# Altium schematic symbol library jlcpcb_2025_04_resistors_extended_1210.schlib: 2670 symbols (part 12 of 14)
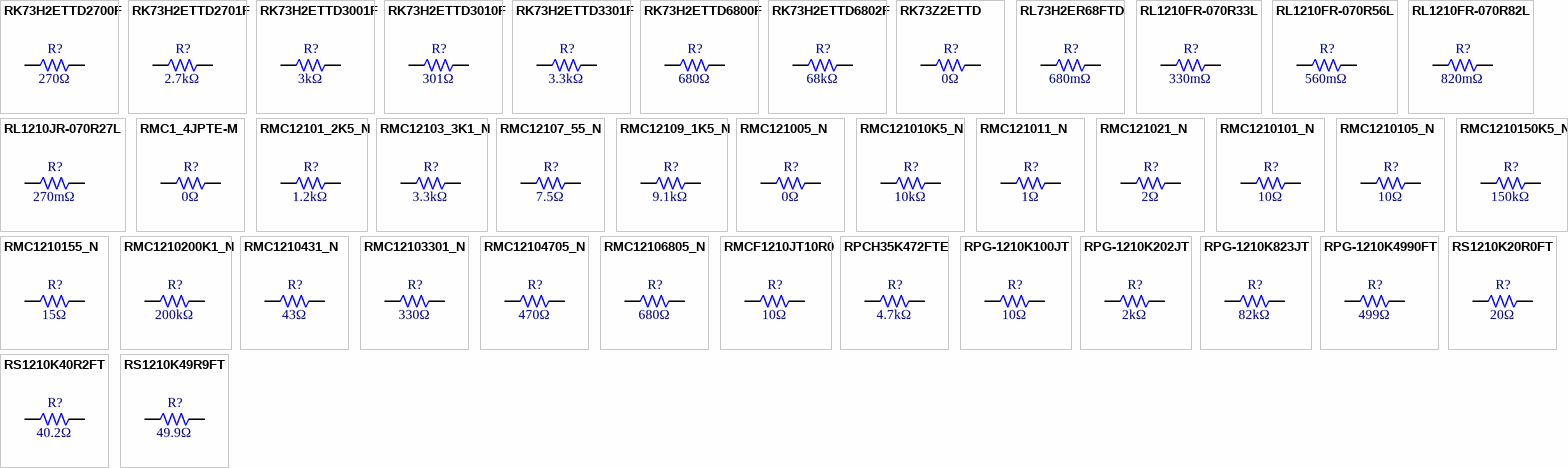
[diagram p77: symbols RK73H2ETTD2700F to RS1210K49R9FT]

## RMC1210105_N
designator R?  Resistance: 10Ω  (hidden comment: *)
Resistor, 10Ω, ±5%, SMD 1210; Manufacturer: Uniroyal; Manufacturer Part Number: RMC1210105%N; Supplier 1: LCSC; Supplier Part Number 1: C269663; JLCPCB Part Number: C269663; Category: Resistors; Package Size: 1210; JLCPCB Basic Part: Yes; Tolerance: ±5%; ComponentLink1Description: Datasheet; ComponentLink1URL: https://wmsc.lcsc.com/wmsc/upload/file/pdf/v2/lcsc/2304140030_TyoHM-RMC1210105-N_C269663.pdf; ComponentLink2Description: JLCPCB Part URL; ComponentLink2URL: https://jlcpcb.com/partdetail/C269663
pins: 1, 2
1 alternate drawing of the same symbol

## RMC1210150K5_N
designator R?  Resistance: 150kΩ  (hidden comment: *)
Resistor, 150kΩ, ±5%, SMD 1210; Manufacturer: Uniroyal; Manufacturer Part Number: RMC1210150K5%N; Supplier 1: LCSC; Supplier Part Number 1: C269664; JLCPCB Part Number: C269664; Category: Resistors; Package Size: 1210; JLCPCB Basic Part: Yes; Tolerance: ±5%; ComponentLink1Description: Datasheet; ComponentLink1URL: https://wmsc.lcsc.com/wmsc/upload/file/pdf/v2/lcsc/2304140030_TyoHM-RMC1210150K5-N_C269664.pdf; ComponentLink2Description: JLCPCB Part URL; ComponentLink2URL: https://jlcpcb.com/partdetail/C269664
pins: 1, 2
1 alternate drawing of the same symbol

## RMC1210155_N
designator R?  Resistance: 15Ω  (hidden comment: *)
Resistor, 15Ω, ±5%, SMD 1210; Manufacturer: Uniroyal; Manufacturer Part Number: RMC1210155%N; Supplier 1: LCSC; Supplier Part Number 1: C269641; JLCPCB Part Number: C269641; Category: Resistors; Package Size: 1210; JLCPCB Basic Part: Yes; Tolerance: ±5%; ComponentLink1Description: Datasheet; ComponentLink1URL: https://wmsc.lcsc.com/wmsc/upload/file/pdf/v2/lcsc/2304140030_TyoHM-RMC1210155-N_C269641.pdf; ComponentLink2Description: JLCPCB Part URL; ComponentLink2URL: https://jlcpcb.com/partdetail/C269641
pins: 1, 2
1 alternate drawing of the same symbol

## RMC1210200K1_N
designator R?  Resistance: 200kΩ  (hidden comment: *)
Resistor, 200kΩ, ±1%, SMD 1210; Manufacturer: Uniroyal; Manufacturer Part Number: RMC1210200K1%N; Supplier 1: LCSC; Supplier Part Number 1: C269665; JLCPCB Part Number: C269665; Category: Resistors; Package Size: 1210; JLCPCB Basic Part: Yes; Tolerance: ±1%; ComponentLink1Description: Datasheet; ComponentLink1URL: https://wmsc.lcsc.com/wmsc/upload/file/pdf/v2/lcsc/2304140030_TyoHM-RMC1210200K1-N_C269665.pdf; ComponentLink2Description: JLCPCB Part URL; ComponentLink2URL: https://jlcpcb.com/partdetail/C269665
pins: 1, 2
1 alternate drawing of the same symbol

## RMC1210431_N
designator R?  Resistance: 43Ω  (hidden comment: *)
Resistor, 43Ω, ±1%, SMD 1210; Manufacturer: Uniroyal; Manufacturer Part Number: RMC1210431%N; Supplier 1: LCSC; Supplier Part Number 1: C269668; JLCPCB Part Number: C269668; Category: Resistors; Package Size: 1210; JLCPCB Basic Part: Yes; Tolerance: ±1%; ComponentLink1Description: Datasheet; ComponentLink1URL: https://wmsc.lcsc.com/wmsc/upload/file/pdf/v2/lcsc/2304140030_TyoHM-RMC1210431-N_C269668.pdf; ComponentLink2Description: JLCPCB Part URL; ComponentLink2URL: https://jlcpcb.com/partdetail/C269668
pins: 1, 2
1 alternate drawing of the same symbol

## RMC12103301_N
designator R?  Resistance: 330Ω  (hidden comment: *)
Resistor, 330Ω, ±1%, SMD 1210; Manufacturer: Uniroyal; Manufacturer Part Number: RMC12103301%N; Supplier 1: LCSC; Supplier Part Number 1: C269638; JLCPCB Part Number: C269638; Category: Resistors; Package Size: 1210; JLCPCB Basic Part: Yes; Tolerance: ±1%; ComponentLink1Description: Datasheet; ComponentLink1URL: https://wmsc.lcsc.com/wmsc/upload/file/pdf/v2/lcsc/2304140030_TyoHM-RMC12103301-N_C269638.pdf; ComponentLink2Description: JLCPCB Part URL; ComponentLink2URL: https://jlcpcb.com/partdetail/C269638
pins: 1, 2
1 alternate drawing of the same symbol

## RMC12104705_N
designator R?  Resistance: 470Ω  (hidden comment: *)
Resistor, 470Ω, ±5%, SMD 1210; Manufacturer: Uniroyal; Manufacturer Part Number: RMC12104705%N; Supplier 1: LCSC; Supplier Part Number 1: C269642; JLCPCB Part Number: C269642; Category: Resistors; Package Size: 1210; JLCPCB Basic Part: Yes; Tolerance: ±5%; ComponentLink1Description: Datasheet; ComponentLink1URL: https://wmsc.lcsc.com/wmsc/upload/file/pdf/v2/lcsc/2304140030_TyoHM-RMC12104705-N_C269642.pdf; ComponentLink2Description: JLCPCB Part URL; ComponentLink2URL: https://jlcpcb.com/partdetail/C269642
pins: 1, 2
1 alternate drawing of the same symbol

## RMC12106805_N
designator R?  Resistance: 680Ω  (hidden comment: *)
Resistor, 680Ω, ±5%, 250mW, SMD 1210; Manufacturer: Uniroyal; Manufacturer Part Number: RMC12106805%N; Supplier 1: LCSC; Supplier Part Number 1: C269643; JLCPCB Part Number: C269643; Power Rating: 250mW; Category: Resistors; Package Size: 1210; JLCPCB Basic Part: Yes; Tolerance: ±5%; ComponentLink1Description: Datasheet; ComponentLink1URL: https://wmsc.lcsc.com/wmsc/upload/file/pdf/v2/lcsc/2304140030_TyoHM-RMC12106805-N_C269643.pdf; ComponentLink2Description: JLCPCB Part URL; ComponentLink2URL: https://jlcpcb.com/partdetail/C269643
pins: 1, 2
1 alternate drawing of the same symbol

## RMCF1210JT10R0
designator R?  Resistance: 10Ω  (hidden comment: *)
Resistor, 10Ω, ±5%, 500mW, 200V, ±200ppm/℃, -55℃~+155℃, SMD 1210; Manufacturer: Uniroyal; Manufacturer Part Number: RMCF1210JT10R0; Supplier 1: LCSC; Supplier Part Number 1: C237736; JLCPCB Part Number: C237736; Power Rating: 500mW; Category: Resistors; Package Size: 1210; JLCPCB Basic Part: Yes; Tolerance: ±5%; Voltage Rating: 200V; Temperature Coefficient: ±200ppm/℃; Temperature Rating: -55℃~+155℃; ComponentLink1Description: Datasheet; ComponentLink1URL: https://wmsc.lcsc.com/wmsc/upload/file/pdf/v2/lcsc/2304140030_SEI-Stackpole-Elec-RMCF1210JT10R0_C237736.pdf; ComponentLink2Description: JLCPCB Part URL; ComponentLink2URL: https://jlcpcb.com/partdetail/C237736
pins: 1, 2
1 alternate drawing of the same symbol

## RPCH35K472FTE
designator R?  Resistance: 4.7kΩ  (hidden comment: *)
Resistor, 4.7kΩ, ±1%, 750mW, ±100ppm/℃, SMD 1210; Manufacturer: Uniroyal; Manufacturer Part Number: RPCH35K472FTE; Supplier 1: LCSC; Supplier Part Number 1: C340545; JLCPCB Part Number: C340545; Power Rating: 750mW; Category: Resistors; Package Size: 1210; JLCPCB Basic Part: Yes; Tolerance: ±1%; Temperature Coefficient: ±100ppm/℃; ComponentLink1Description: Datasheet; ComponentLink1URL: https://wmsc.lcsc.com/wmsc/upload/file/pdf/v2/lcsc/2304140030_KAMAYA-RPCH35K472FTE_C340545.pdf; ComponentLink2Description: JLCPCB Part URL; ComponentLink2URL: https://jlcpcb.com/partdetail/C340545
pins: 1, 2
1 alternate drawing of the same symbol

## RPG-1210K100JT
designator R?  Resistance: 10Ω  (hidden comment: *)
Resistor, 10Ω, ±5%, 500mW, ±100ppm/℃, -55℃~+155℃, SMD 1210; Manufacturer: Uniroyal; Manufacturer Part Number: RPG-1210K100JT; Supplier 1: LCSC; Supplier Part Number 1: C2991631; JLCPCB Part Number: C2991631; Power Rating: 500mW; Category: Resistors; Package Size: 1210; JLCPCB Basic Part: Yes; Tolerance: ±5%; Temperature Coefficient: ±100ppm/℃; Temperature Rating: -55℃~+155℃; ComponentLink1Description: Datasheet; ComponentLink1URL: https://wmsc.lcsc.com/wmsc/upload/file/pdf/v2/lcsc/2204111630_FH--Guangdong-Fenghua-Advanced-Tech-RPG-1210K100JT_C2991631.pdf; ComponentLink2Description: JLCPCB Part URL; ComponentLink2URL: https://jlcpcb.com/partdetail/C2991631
pins: 1, 2
1 alternate drawing of the same symbol

## RPG-1210K202JT
designator R?  Resistance: 2kΩ  (hidden comment: *)
Resistor, 2kΩ, ±5%, 500mW, ±100ppm/℃, -55℃~+155℃, SMD 1210; Manufacturer: Uniroyal; Manufacturer Part Number: RPG-1210K202JT; Supplier 1: LCSC; Supplier Part Number 1: C2961472; JLCPCB Part Number: C2961472; Power Rating: 500mW; Category: Resistors; Package Size: 1210; JLCPCB Basic Part: Yes; Tolerance: ±5%; Temperature Coefficient: ±100ppm/℃; Temperature Rating: -55℃~+155℃; ComponentLink1Description: Datasheet; ComponentLink1URL: https://wmsc.lcsc.com/wmsc/upload/file/pdf/v2/lcsc/2202090930_FH--Guangdong-Fenghua-Advanced-Tech-RPG-1210K202JT_C2961472.pdf; ComponentLink2Description: JLCPCB Part URL; ComponentLink2URL: https://jlcpcb.com/partdetail/C2961472
pins: 1, 2
1 alternate drawing of the same symbol

## RPG-1210K823JT
designator R?  Resistance: 82kΩ  (hidden comment: *)
Resistor, 82kΩ, ±5%, 500mW, ±100ppm/℃, -55℃~+155℃, SMD 1210; Manufacturer: Uniroyal; Manufacturer Part Number: RPG-1210K823JT; Supplier 1: LCSC; Supplier Part Number 1: C2961474; JLCPCB Part Number: C2961474; Power Rating: 500mW; Category: Resistors; Package Size: 1210; JLCPCB Basic Part: Yes; Tolerance: ±5%; Temperature Coefficient: ±100ppm/℃; Temperature Rating: -55℃~+155℃; ComponentLink1Description: Datasheet; ComponentLink1URL: https://wmsc.lcsc.com/wmsc/upload/file/pdf/v2/lcsc/2202090930_FH--Guangdong-Fenghua-Advanced-Tech-RPG-1210K823JT_C2961474.pdf; ComponentLink2Description: JLCPCB Part URL; ComponentLink2URL: https://jlcpcb.com/partdetail/C2961474
pins: 1, 2
1 alternate drawing of the same symbol

## RPG-1210K4990FT
designator R?  Resistance: 499Ω  (hidden comment: *)
Resistor, 499Ω, ±1%, 500mW, 200V, ±100ppm/℃, -55℃~+155℃, SMD 1210; Manufacturer: Uniroyal; Manufacturer Part Number: RPG-1210K4990FT; Supplier 1: LCSC; Supplier Part Number 1: C341631; JLCPCB Part Number: C341631; Power Rating: 500mW; Category: Resistors; Package Size: 1210; JLCPCB Basic Part: Yes; Tolerance: ±1%; Voltage Rating: 200V; Temperature Coefficient: ±100ppm/℃; Temperature Rating: -55℃~+155℃; ComponentLink1Description: Datasheet; ComponentLink1URL: https://wmsc.lcsc.com/wmsc/upload/file/pdf/v2/lcsc/2304140030_FH--Guangdong-Fenghua-Advanced-Tech-RPG-1210K4990FT_C341631.pdf; ComponentLink2Description: JLCPCB Part URL; ComponentLink2URL: https://jlcpcb.com/partdetail/C341631
pins: 1, 2
1 alternate drawing of the same symbol

## RS1210K20R0FT
designator R?  Resistance: 20Ω  (hidden comment: *)
Resistor, 20Ω, ±1%, 333.333mW, ±100ppm/℃, SMD 1210; Manufacturer: Uniroyal; Manufacturer Part Number: RS1210K20R0FT; Supplier 1: LCSC; Supplier Part Number 1: C1322500; JLCPCB Part Number: C1322500; Power Rating: 333.333mW; Category: Resistors; Package Size: 1210; JLCPCB Basic Part: Yes; Tolerance: ±1%; Temperature Coefficient: ±100ppm/℃; ComponentLink1Description: Datasheet; ComponentLink1URL: https://wmsc.lcsc.com/wmsc/upload/file/pdf/v2/lcsc/2304140030_FH--Guangdong-Fenghua-Advanced-Tech-RS1210K20R0FT_C1322500.pdf; ComponentLink2Description: JLCPCB Part URL; ComponentLink2URL: https://jlcpcb.com/partdetail/C1322500
pins: 1, 2
1 alternate drawing of the same symbol

## RS1210K40R2FT
designator R?  Resistance: 40.2Ω  (hidden comment: *)
Resistor, 40.2Ω, ±1%, 333.333mW, ±100ppm/℃, SMD 1210; Manufacturer: Uniroyal; Manufacturer Part Number: RS1210K40R2FT; Supplier 1: LCSC; Supplier Part Number 1: C1322515; JLCPCB Part Number: C1322515; Power Rating: 333.333mW; Category: Resistors; Package Size: 1210; JLCPCB Basic Part: Yes; Tolerance: ±1%; Temperature Coefficient: ±100ppm/℃; ComponentLink1Description: Datasheet; ComponentLink1URL: https://wmsc.lcsc.com/wmsc/upload/file/pdf/v2/lcsc/2304140030_FH--Guangdong-Fenghua-Advanced-Tech-RS1210K40R2FT_C1322515.pdf; ComponentLink2Description: JLCPCB Part URL; ComponentLink2URL: https://jlcpcb.com/partdetail/C1322515
pins: 1, 2
1 alternate drawing of the same symbol

## RS1210K49R9FT
designator R?  Resistance: 49.9Ω  (hidden comment: *)
Resistor, 49.9Ω, ±1%, 333.333mW, ±100ppm/℃, SMD 1210; Manufacturer: Uniroyal; Manufacturer Part Number: RS1210K49R9FT; Supplier 1: LCSC; Supplier Part Number 1: C1322519; JLCPCB Part Number: C1322519; Power Rating: 333.333mW; Category: Resistors; Package Size: 1210; JLCPCB Basic Part: Yes; Tolerance: ±1%; Temperature Coefficient: ±100ppm/℃; ComponentLink1Description: Datasheet; ComponentLink1URL: https://wmsc.lcsc.com/wmsc/upload/file/pdf/v2/lcsc/2304140030_FH--Guangdong-Fenghua-Advanced-Tech-RS1210K49R9FT_C1322519.pdf; ComponentLink2Description: JLCPCB Part URL; ComponentLink2URL: https://jlcpcb.com/partdetail/C1322519
pins: 1, 2
1 alternate drawing of the same symbol

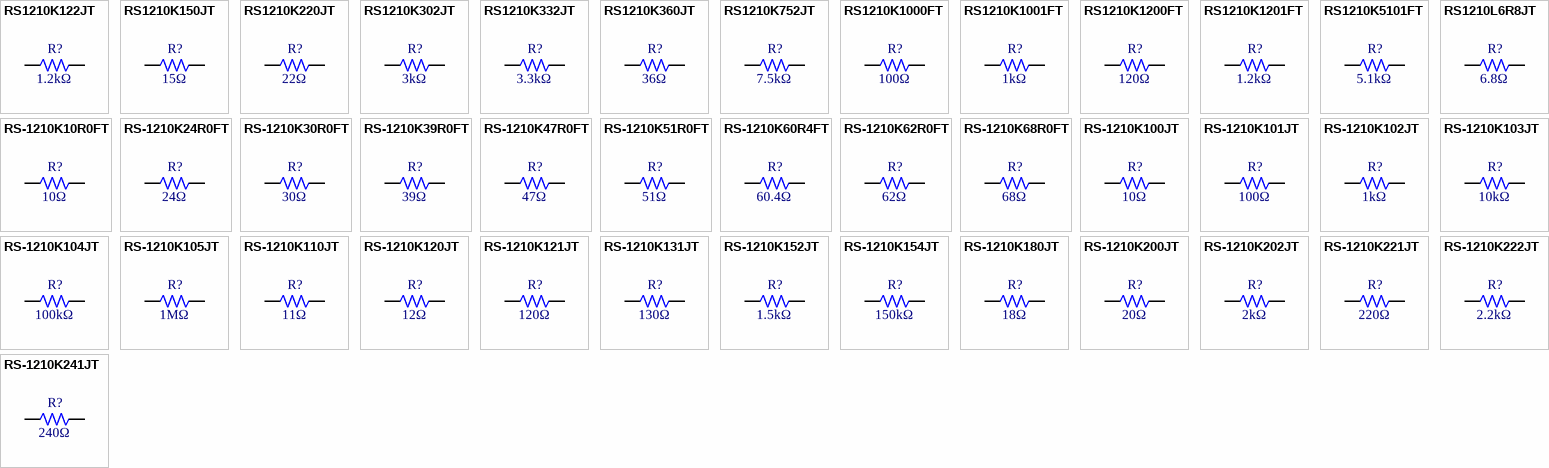
[diagram p54: symbols RS1210K122JT to RS-1210K241JT]

## RS1210K122JT
designator R?  Resistance: 1.2kΩ  (hidden comment: *)
Resistor, 1.2kΩ, ±5%, 333.333mW, ±100ppm/℃, SMD 1210; Manufacturer: Uniroyal; Manufacturer Part Number: RS1210K122JT; Supplier 1: LCSC; Supplier Part Number 1: C1322491; JLCPCB Part Number: C1322491; Power Rating: 333.333mW; Category: Resistors; Package Size: 1210; JLCPCB Basic Part: Yes; Tolerance: ±5%; Temperature Coefficient: ±100ppm/℃; ComponentLink1Description: Datasheet; ComponentLink1URL: https://wmsc.lcsc.com/wmsc/upload/file/pdf/v2/lcsc/2304140030_FH--Guangdong-Fenghua-Advanced-Tech-RS1210K122JT_C1322491.pdf; ComponentLink2Description: JLCPCB Part URL; ComponentLink2URL: https://jlcpcb.com/partdetail/C1322491
pins: 1, 2
1 alternate drawing of the same symbol

## RS1210K150JT
designator R?  Resistance: 15Ω  (hidden comment: *)
Resistor, 15Ω, ±5%, 333.333mW, ±100ppm/℃, SMD 1210; Manufacturer: Uniroyal; Manufacturer Part Number: RS1210K150JT; Supplier 1: LCSC; Supplier Part Number 1: C1322495; JLCPCB Part Number: C1322495; Power Rating: 333.333mW; Category: Resistors; Package Size: 1210; JLCPCB Basic Part: Yes; Tolerance: ±5%; Temperature Coefficient: ±100ppm/℃; ComponentLink1Description: Datasheet; ComponentLink1URL: https://wmsc.lcsc.com/wmsc/upload/file/pdf/v2/lcsc/2304140030_FH--Guangdong-Fenghua-Advanced-Tech-RS1210K150JT_C1322495.pdf; ComponentLink2Description: JLCPCB Part URL; ComponentLink2URL: https://jlcpcb.com/partdetail/C1322495
pins: 1, 2
1 alternate drawing of the same symbol

## RS1210K220JT
designator R?  Resistance: 22Ω  (hidden comment: *)
Resistor, 22Ω, ±5%, 333.333mW, ±100ppm/℃, SMD 1210; Manufacturer: Uniroyal; Manufacturer Part Number: RS1210K220JT; Supplier 1: LCSC; Supplier Part Number 1: C1322503; JLCPCB Part Number: C1322503; Power Rating: 333.333mW; Category: Resistors; Package Size: 1210; JLCPCB Basic Part: Yes; Tolerance: ±5%; Temperature Coefficient: ±100ppm/℃; ComponentLink1Description: Datasheet; ComponentLink1URL: https://wmsc.lcsc.com/wmsc/upload/file/pdf/v2/lcsc/2304140030_FH--Guangdong-Fenghua-Advanced-Tech-RS1210K220JT_C1322503.pdf; ComponentLink2Description: JLCPCB Part URL; ComponentLink2URL: https://jlcpcb.com/partdetail/C1322503
pins: 1, 2
1 alternate drawing of the same symbol

## RS1210K302JT
designator R?  Resistance: 3kΩ  (hidden comment: *)
Resistor, 3kΩ, ±5%, 333.333mW, ±100ppm/℃, SMD 1210; Manufacturer: Uniroyal; Manufacturer Part Number: RS1210K302JT; Supplier 1: LCSC; Supplier Part Number 1: C1322510; JLCPCB Part Number: C1322510; Power Rating: 333.333mW; Category: Resistors; Package Size: 1210; JLCPCB Basic Part: Yes; Tolerance: ±5%; Temperature Coefficient: ±100ppm/℃; ComponentLink1Description: Datasheet; ComponentLink1URL: https://wmsc.lcsc.com/wmsc/upload/file/pdf/v2/lcsc/2304140030_FH--Guangdong-Fenghua-Advanced-Tech-RS1210K302JT_C1322510.pdf; ComponentLink2Description: JLCPCB Part URL; ComponentLink2URL: https://jlcpcb.com/partdetail/C1322510
pins: 1, 2
1 alternate drawing of the same symbol

## RS1210K332JT
designator R?  Resistance: 3.3kΩ  (hidden comment: *)
Resistor, 3.3kΩ, ±5%, 333.333mW, ±100ppm/℃, SMD 1210; Manufacturer: Uniroyal; Manufacturer Part Number: RS1210K332JT; Supplier 1: LCSC; Supplier Part Number 1: C1322512; JLCPCB Part Number: C1322512; Power Rating: 333.333mW; Category: Resistors; Package Size: 1210; JLCPCB Basic Part: Yes; Tolerance: ±5%; Temperature Coefficient: ±100ppm/℃; ComponentLink1Description: Datasheet; ComponentLink1URL: https://wmsc.lcsc.com/wmsc/upload/file/pdf/v2/lcsc/2304140030_FH--Guangdong-Fenghua-Advanced-Tech-RS1210K332JT_C1322512.pdf; ComponentLink2Description: JLCPCB Part URL; ComponentLink2URL: https://jlcpcb.com/partdetail/C1322512
pins: 1, 2
1 alternate drawing of the same symbol

## RS1210K360JT
designator R?  Resistance: 36Ω  (hidden comment: *)
Resistor, 36Ω, ±5%, 333.333mW, ±100ppm/℃, SMD 1210; Manufacturer: Uniroyal; Manufacturer Part Number: RS1210K360JT; Supplier 1: LCSC; Supplier Part Number 1: C1322514; JLCPCB Part Number: C1322514; Power Rating: 333.333mW; Category: Resistors; Package Size: 1210; JLCPCB Basic Part: Yes; Tolerance: ±5%; Temperature Coefficient: ±100ppm/℃; ComponentLink1Description: Datasheet; ComponentLink1URL: https://wmsc.lcsc.com/wmsc/upload/file/pdf/v2/lcsc/2304140030_FH--Guangdong-Fenghua-Advanced-Tech-RS1210K360JT_C1322514.pdf; ComponentLink2Description: JLCPCB Part URL; ComponentLink2URL: https://jlcpcb.com/partdetail/C1322514
pins: 1, 2
1 alternate drawing of the same symbol

## RS1210K752JT
designator R?  Resistance: 7.5kΩ  (hidden comment: *)
Resistor, 7.5kΩ, ±5%, 333.333mW, ±100ppm/℃, SMD 1210; Manufacturer: Uniroyal; Manufacturer Part Number: RS1210K752JT; Supplier 1: LCSC; Supplier Part Number 1: C1322528; JLCPCB Part Number: C1322528; Power Rating: 333.333mW; Category: Resistors; Package Size: 1210; JLCPCB Basic Part: Yes; Tolerance: ±5%; Temperature Coefficient: ±100ppm/℃; ComponentLink1Description: Datasheet; ComponentLink1URL: https://wmsc.lcsc.com/wmsc/upload/file/pdf/v2/lcsc/2304140030_FH--Guangdong-Fenghua-Advanced-Tech-RS1210K752JT_C1322528.pdf; ComponentLink2Description: JLCPCB Part URL; ComponentLink2URL: https://jlcpcb.com/partdetail/C1322528
pins: 1, 2
1 alternate drawing of the same symbol

## RS1210K1000FT
designator R?  Resistance: 100Ω  (hidden comment: *)
Resistor, 100Ω, ±1%, 333.333mW, ±100ppm/℃, SMD 1210; Manufacturer: Uniroyal; Manufacturer Part Number: RS1210K1000FT; Supplier 1: LCSC; Supplier Part Number 1: C1322487; JLCPCB Part Number: C1322487; Power Rating: 333.333mW; Category: Resistors; Package Size: 1210; JLCPCB Basic Part: Yes; Tolerance: ±1%; Temperature Coefficient: ±100ppm/℃; ComponentLink1Description: Datasheet; ComponentLink1URL: https://wmsc.lcsc.com/wmsc/upload/file/pdf/v2/lcsc/2304140030_FH--Guangdong-Fenghua-Advanced-Tech-RS1210K1000FT_C1322487.pdf; ComponentLink2Description: JLCPCB Part URL; ComponentLink2URL: https://jlcpcb.com/partdetail/C1322487
pins: 1, 2
1 alternate drawing of the same symbol

## RS1210K1001FT
designator R?  Resistance: 1kΩ  (hidden comment: *)
Resistor, 1kΩ, ±1%, 333.333mW, ±100ppm/℃, SMD 1210; Manufacturer: Uniroyal; Manufacturer Part Number: RS1210K1001FT; Supplier 1: LCSC; Supplier Part Number 1: C1322488; JLCPCB Part Number: C1322488; Power Rating: 333.333mW; Category: Resistors; Package Size: 1210; JLCPCB Basic Part: Yes; Tolerance: ±1%; Temperature Coefficient: ±100ppm/℃; ComponentLink1Description: Datasheet; ComponentLink1URL: https://wmsc.lcsc.com/wmsc/upload/file/pdf/v2/lcsc/2304140030_FH--Guangdong-Fenghua-Advanced-Tech-RS1210K1001FT_C1322488.pdf; ComponentLink2Description: JLCPCB Part URL; ComponentLink2URL: https://jlcpcb.com/partdetail/C1322488
pins: 1, 2
1 alternate drawing of the same symbol

## RS1210K1200FT
designator R?  Resistance: 120Ω  (hidden comment: *)
Resistor, 120Ω, ±1%, 333.333mW, ±100ppm/℃, SMD 1210; Manufacturer: Uniroyal; Manufacturer Part Number: RS1210K1200FT; Supplier 1: LCSC; Supplier Part Number 1: C1322489; JLCPCB Part Number: C1322489; Power Rating: 333.333mW; Category: Resistors; Package Size: 1210; JLCPCB Basic Part: Yes; Tolerance: ±1%; Temperature Coefficient: ±100ppm/℃; ComponentLink1Description: Datasheet; ComponentLink1URL: https://wmsc.lcsc.com/wmsc/upload/file/pdf/v2/lcsc/2304140030_FH--Guangdong-Fenghua-Advanced-Tech-RS1210K1200FT_C1322489.pdf; ComponentLink2Description: JLCPCB Part URL; ComponentLink2URL: https://jlcpcb.com/partdetail/C1322489
pins: 1, 2
1 alternate drawing of the same symbol

## RS1210K1201FT
designator R?  Resistance: 1.2kΩ  (hidden comment: *)
Resistor, 1.2kΩ, ±1%, 333.333mW, ±100ppm/℃, SMD 1210; Manufacturer: Uniroyal; Manufacturer Part Number: RS1210K1201FT; Supplier 1: LCSC; Supplier Part Number 1: C1322490; JLCPCB Part Number: C1322490; Power Rating: 333.333mW; Category: Resistors; Package Size: 1210; JLCPCB Basic Part: Yes; Tolerance: ±1%; Temperature Coefficient: ±100ppm/℃; ComponentLink1Description: Datasheet; ComponentLink1URL: https://wmsc.lcsc.com/wmsc/upload/file/pdf/v2/lcsc/2304140030_FH--Guangdong-Fenghua-Advanced-Tech-RS1210K1201FT_C1322490.pdf; ComponentLink2Description: JLCPCB Part URL; ComponentLink2URL: https://jlcpcb.com/partdetail/C1322490
pins: 1, 2
1 alternate drawing of the same symbol

## RS1210K5101FT
designator R?  Resistance: 5.1kΩ  (hidden comment: *)
Resistor, 5.1kΩ, ±1%, 333.333mW, ±100ppm/℃, SMD 1210; Manufacturer: Uniroyal; Manufacturer Part Number: RS1210K5101FT; Supplier 1: LCSC; Supplier Part Number 1: C1322520; JLCPCB Part Number: C1322520; Power Rating: 333.333mW; Category: Resistors; Package Size: 1210; JLCPCB Basic Part: Yes; Tolerance: ±1%; Temperature Coefficient: ±100ppm/℃; ComponentLink1Description: Datasheet; ComponentLink1URL: https://wmsc.lcsc.com/wmsc/upload/file/pdf/v2/lcsc/2304140030_FH--Guangdong-Fenghua-Advanced-Tech-RS1210K5101FT_C1322520.pdf; ComponentLink2Description: JLCPCB Part URL; ComponentLink2URL: https://jlcpcb.com/partdetail/C1322520
pins: 1, 2
1 alternate drawing of the same symbol

## RS1210L6R8JT
designator R?  Resistance: 6.8Ω  (hidden comment: *)
Resistor, 6.8Ω, ±5%, 333.333mW, ±250ppm/℃, SMD 1210; Manufacturer: Uniroyal; Manufacturer Part Number: RS1210L6R8JT; Supplier 1: LCSC; Supplier Part Number 1: C1322534; JLCPCB Part Number: C1322534; Power Rating: 333.333mW; Category: Resistors; Package Size: 1210; JLCPCB Basic Part: Yes; Tolerance: ±5%; Temperature Coefficient: ±250ppm/℃; ComponentLink1Description: Datasheet; ComponentLink1URL: https://wmsc.lcsc.com/wmsc/upload/file/pdf/v2/lcsc/2304140030_FH--Guangdong-Fenghua-Advanced-Tech-RS1210L6R8JT_C1322534.pdf; ComponentLink2Description: JLCPCB Part URL; ComponentLink2URL: https://jlcpcb.com/partdetail/C1322534
pins: 1, 2
1 alternate drawing of the same symbol

## RS-1210K10R0FT
designator R?  Resistance: 10Ω  (hidden comment: *)
Resistor, 10Ω, ±1%, 333.333mW, 200V, ±100ppm/℃, -55℃~+155℃, SMD 1210; Manufacturer: Uniroyal; Manufacturer Part Number: RS-1210K10R0FT; Supplier 1: LCSC; Supplier Part Number 1: C327447; JLCPCB Part Number: C327447; Power Rating: 333.333mW; Category: Resistors; Package Size: 1210; JLCPCB Basic Part: Yes; Tolerance: ±1%; Voltage Rating: 200V; Temperature Coefficient: ±100ppm/℃; Temperature Rating: -55℃~+155℃; ComponentLink1Description: Datasheet; ComponentLink1URL: https://wmsc.lcsc.com/wmsc/upload/file/pdf/v2/lcsc/2304140030_FH--Guangdong-Fenghua-Advanced-Tech-RS-1210K10R0FT_C327447.pdf; ComponentLink2Description: JLCPCB Part URL; ComponentLink2URL: https://jlcpcb.com/partdetail/C327447
pins: 1, 2
1 alternate drawing of the same symbol

## RS-1210K24R0FT
designator R?  Resistance: 24Ω  (hidden comment: *)
Resistor, 24Ω, ±1%, 333.333mW, 200V, ±100ppm/℃, -55℃~+155℃, SMD 1210; Manufacturer: Uniroyal; Manufacturer Part Number: RS-1210K24R0FT; Supplier 1: LCSC; Supplier Part Number 1: C341618; JLCPCB Part Number: C341618; Power Rating: 333.333mW; Category: Resistors; Package Size: 1210; JLCPCB Basic Part: Yes; Tolerance: ±1%; Voltage Rating: 200V; Temperature Coefficient: ±100ppm/℃; Temperature Rating: -55℃~+155℃; ComponentLink1Description: Datasheet; ComponentLink1URL: https://wmsc.lcsc.com/wmsc/upload/file/pdf/v2/lcsc/2304140030_FH--Guangdong-Fenghua-Advanced-Tech-RS-1210K24R0FT_C341618.pdf; ComponentLink2Description: JLCPCB Part URL; ComponentLink2URL: https://jlcpcb.com/partdetail/C341618
pins: 1, 2
1 alternate drawing of the same symbol

## RS-1210K30R0FT
designator R?  Resistance: 30Ω  (hidden comment: *)
Resistor, 30Ω, ±1%, 333.333mW, ±100ppm/℃, -55℃~+155℃, SMD 1210; Manufacturer: Uniroyal; Manufacturer Part Number: RS-1210K30R0FT; Supplier 1: LCSC; Supplier Part Number 1: C2961541; JLCPCB Part Number: C2961541; Power Rating: 333.333mW; Category: Resistors; Package Size: 1210; JLCPCB Basic Part: Yes; Tolerance: ±1%; Temperature Coefficient: ±100ppm/℃; Temperature Rating: -55℃~+155℃; ComponentLink1Description: Datasheet; ComponentLink1URL: https://wmsc.lcsc.com/wmsc/upload/file/pdf/v2/lcsc/2202211530_FH--Guangdong-Fenghua-Advanced-Tech-RS-1210K30R0FT_C2961541.pdf; ComponentLink2Description: JLCPCB Part URL; ComponentLink2URL: https://jlcpcb.com/partdetail/C2961541
pins: 1, 2
1 alternate drawing of the same symbol

## RS-1210K39R0FT
designator R?  Resistance: 39Ω  (hidden comment: *)
Resistor, 39Ω, ±1%, 333.333mW, ±100ppm/℃, -55℃~+155℃, SMD 1210; Manufacturer: Uniroyal; Manufacturer Part Number: RS-1210K39R0FT; Supplier 1: LCSC; Supplier Part Number 1: C2939822; JLCPCB Part Number: C2939822; Power Rating: 333.333mW; Category: Resistors; Package Size: 1210; JLCPCB Basic Part: Yes; Tolerance: ±1%; Temperature Coefficient: ±100ppm/℃; Temperature Rating: -55℃~+155℃; ComponentLink1Description: Datasheet; ComponentLink1URL: https://wmsc.lcsc.com/wmsc/upload/file/pdf/v2/lcsc/2201121830_FH--Guangdong-Fenghua-Advanced-Tech-RS-1210K39R0FT_C2939822.pdf; ComponentLink2Description: JLCPCB Part URL; ComponentLink2URL: https://jlcpcb.com/partdetail/C2939822
pins: 1, 2
1 alternate drawing of the same symbol

## RS-1210K47R0FT
designator R?  Resistance: 47Ω  (hidden comment: *)
Resistor, 47Ω, ±1%, 250mW, 200V, ±200ppm/℃, SMD 1210; Manufacturer: Uniroyal; Manufacturer Part Number: RS-1210K47R0FT; Supplier 1: LCSC; Supplier Part Number 1: C2936641; JLCPCB Part Number: C2936641; Power Rating: 250mW; Category: Resistors; Package Size: 1210; JLCPCB Basic Part: Yes; Tolerance: ±1%; Voltage Rating: 200V; Temperature Coefficient: ±200ppm/℃; ComponentLink1Description: Datasheet; ComponentLink1URL: https://wmsc.lcsc.com/wmsc/upload/file/pdf/v2/lcsc/2201121730_FH--Guangdong-Fenghua-Advanced-Tech-RS-1210K47R0FT_C2936641.pdf; ComponentLink2Description: JLCPCB Part URL; ComponentLink2URL: https://jlcpcb.com/partdetail/C2936641
pins: 1, 2
1 alternate drawing of the same symbol

## RS-1210K51R0FT
designator R?  Resistance: 51Ω  (hidden comment: *)
Resistor, 51Ω, ±1%, 333.333mW, 200V, ±100ppm/℃, -55℃~+155℃, SMD 1210; Manufacturer: Uniroyal; Manufacturer Part Number: RS-1210K51R0FT; Supplier 1: LCSC; Supplier Part Number 1: C341625; JLCPCB Part Number: C341625; Power Rating: 333.333mW; Category: Resistors; Package Size: 1210; JLCPCB Basic Part: Yes; Tolerance: ±1%; Voltage Rating: 200V; Temperature Coefficient: ±100ppm/℃; Temperature Rating: -55℃~+155℃; ComponentLink1Description: Datasheet; ComponentLink1URL: https://wmsc.lcsc.com/wmsc/upload/file/pdf/v2/lcsc/2304140030_FH--Guangdong-Fenghua-Advanced-Tech-RS-1210K51R0FT_C341625.pdf; ComponentLink2Description: JLCPCB Part URL; ComponentLink2URL: https://jlcpcb.com/partdetail/C341625
pins: 1, 2
1 alternate drawing of the same symbol

## RS-1210K60R4FT
designator R?  Resistance: 60.4Ω  (hidden comment: *)
Resistor, 60.4Ω, ±1%, 250mW, 200V, ±200ppm/℃, SMD 1210; Manufacturer: Uniroyal; Manufacturer Part Number: RS-1210K60R4FT; Supplier 1: LCSC; Supplier Part Number 1: C2936664; JLCPCB Part Number: C2936664; Power Rating: 250mW; Category: Resistors; Package Size: 1210; JLCPCB Basic Part: Yes; Tolerance: ±1%; Voltage Rating: 200V; Temperature Coefficient: ±200ppm/℃; ComponentLink1Description: Datasheet; ComponentLink1URL: https://wmsc.lcsc.com/wmsc/upload/file/pdf/v2/lcsc/2201121730_FH--Guangdong-Fenghua-Advanced-Tech-RS-1210K60R4FT_C2936664.pdf; ComponentLink2Description: JLCPCB Part URL; ComponentLink2URL: https://jlcpcb.com/partdetail/C2936664
pins: 1, 2
1 alternate drawing of the same symbol

## RS-1210K62R0FT
designator R?  Resistance: 62Ω  (hidden comment: *)
Resistor, 62Ω, ±1%, 333.333mW, ±100ppm/℃, -55℃~+155℃, SMD 1210; Manufacturer: Uniroyal; Manufacturer Part Number: RS-1210K62R0FT; Supplier 1: LCSC; Supplier Part Number 1: C2961546; JLCPCB Part Number: C2961546; Power Rating: 333.333mW; Category: Resistors; Package Size: 1210; JLCPCB Basic Part: Yes; Tolerance: ±1%; Temperature Coefficient: ±100ppm/℃; Temperature Rating: -55℃~+155℃; ComponentLink1Description: Datasheet; ComponentLink1URL: https://wmsc.lcsc.com/wmsc/upload/file/pdf/v2/lcsc/2202211530_FH--Guangdong-Fenghua-Advanced-Tech-RS-1210K62R0FT_C2961546.pdf; ComponentLink2Description: JLCPCB Part URL; ComponentLink2URL: https://jlcpcb.com/partdetail/C2961546
pins: 1, 2
1 alternate drawing of the same symbol

## RS-1210K68R0FT
designator R?  Resistance: 68Ω  (hidden comment: *)
Resistor, 68Ω, ±1%, 333.333mW, ±100ppm/℃, SMD 1210; Manufacturer: Uniroyal; Manufacturer Part Number: RS-1210K68R0FT; Supplier 1: LCSC; Supplier Part Number 1: C880430; JLCPCB Part Number: C880430; Power Rating: 333.333mW; Category: Resistors; Package Size: 1210; JLCPCB Basic Part: Yes; Tolerance: ±1%; Temperature Coefficient: ±100ppm/℃; ComponentLink1Description: Datasheet; ComponentLink1URL: https://wmsc.lcsc.com/wmsc/upload/file/pdf/v2/lcsc/2304140030_FH--Guangdong-Fenghua-Advanced-Tech-RS-1210K68R0FT_C880430.pdf; ComponentLink2Description: JLCPCB Part URL; ComponentLink2URL: https://jlcpcb.com/partdetail/C880430
pins: 1, 2
1 alternate drawing of the same symbol

## RS-1210K100JT
designator R?  Resistance: 10Ω  (hidden comment: *)
Resistor, 10Ω, ±5%, 333.333mW, ±100ppm/℃, -55℃~+155℃, SMD 1210; Manufacturer: Uniroyal; Manufacturer Part Number: RS-1210K100JT; Supplier 1: LCSC; Supplier Part Number 1: C139998; JLCPCB Part Number: C139998; Power Rating: 333.333mW; Category: Resistors; Package Size: 1210; JLCPCB Basic Part: Yes; Tolerance: ±5%; Temperature Coefficient: ±100ppm/℃; Temperature Rating: -55℃~+155℃; ComponentLink1Description: Datasheet; ComponentLink1URL: https://wmsc.lcsc.com/wmsc/upload/file/pdf/v2/lcsc/2304140030_FH--Guangdong-Fenghua-Advanced-Tech-RS-1210K100JT_C139998.pdf; ComponentLink2Description: JLCPCB Part URL; ComponentLink2URL: https://jlcpcb.com/partdetail/C139998
pins: 1, 2
1 alternate drawing of the same symbol

## RS-1210K101JT
designator R?  Resistance: 100Ω  (hidden comment: *)
Resistor, 100Ω, ±5%, 333.333mW, 200V, ±100ppm/℃, -55℃~+155℃, SMD 1210; Manufacturer: Uniroyal; Manufacturer Part Number: RS-1210K101JT; Supplier 1: LCSC; Supplier Part Number 1: C139999; JLCPCB Part Number: C139999; Power Rating: 333.333mW; Category: Resistors; Package Size: 1210; JLCPCB Basic Part: Yes; Tolerance: ±5%; Voltage Rating: 200V; Temperature Coefficient: ±100ppm/℃; Temperature Rating: -55℃~+155℃; ComponentLink1Description: Datasheet; ComponentLink1URL: https://wmsc.lcsc.com/wmsc/upload/file/pdf/v2/lcsc/2304140030_FH--Guangdong-Fenghua-Advanced-Tech-RS-1210K101JT_C139999.pdf; ComponentLink2Description: JLCPCB Part URL; ComponentLink2URL: https://jlcpcb.com/partdetail/C139999
pins: 1, 2
1 alternate drawing of the same symbol

## RS-1210K102JT
designator R?  Resistance: 1kΩ  (hidden comment: *)
Resistor, 1kΩ, ±5%, 333.333mW, 200V, ±100ppm/℃, -55℃~+155℃, SMD 1210; Manufacturer: Uniroyal; Manufacturer Part Number: RS-1210K102JT; Supplier 1: LCSC; Supplier Part Number 1: C139997; JLCPCB Part Number: C139997; Power Rating: 333.333mW; Category: Resistors; Package Size: 1210; JLCPCB Basic Part: Yes; Tolerance: ±5%; Voltage Rating: 200V; Temperature Coefficient: ±100ppm/℃; Temperature Rating: -55℃~+155℃; ComponentLink1Description: Datasheet; ComponentLink1URL: https://wmsc.lcsc.com/wmsc/upload/file/pdf/v2/lcsc/2304140030_FH--Guangdong-Fenghua-Advanced-Tech-RS-1210K102JT_C139997.pdf; ComponentLink2Description: JLCPCB Part URL; ComponentLink2URL: https://jlcpcb.com/partdetail/C139997
pins: 1, 2
1 alternate drawing of the same symbol

## RS-1210K103JT
designator R?  Resistance: 10kΩ  (hidden comment: *)
Resistor, 10kΩ, ±5%, 333.333mW, 200V, ±100ppm/℃, -55℃~+155℃, SMD 1210; Manufacturer: Uniroyal; Manufacturer Part Number: RS-1210K103JT; Supplier 1: LCSC; Supplier Part Number 1: C286689; JLCPCB Part Number: C286689; Power Rating: 333.333mW; Category: Resistors; Package Size: 1210; JLCPCB Basic Part: Yes; Tolerance: ±5%; Voltage Rating: 200V; Temperature Coefficient: ±100ppm/℃; Temperature Rating: -55℃~+155℃; ComponentLink1Description: Datasheet; ComponentLink1URL: https://wmsc.lcsc.com/wmsc/upload/file/pdf/v2/lcsc/2304140030_FH--Guangdong-Fenghua-Advanced-Tech-RS-1210K103JT_C286689.pdf; ComponentLink2Description: JLCPCB Part URL; ComponentLink2URL: https://jlcpcb.com/partdetail/C286689
pins: 1, 2
1 alternate drawing of the same symbol

## RS-1210K104JT
designator R?  Resistance: 100kΩ  (hidden comment: *)
Resistor, 100kΩ, ±5%, 333.333mW, 200V, ±100ppm/℃, -55℃~+155℃, SMD 1210; Manufacturer: Uniroyal; Manufacturer Part Number: RS-1210K104JT; Supplier 1: LCSC; Supplier Part Number 1: C304940; JLCPCB Part Number: C304940; Power Rating: 333.333mW; Category: Resistors; Package Size: 1210; JLCPCB Basic Part: Yes; Tolerance: ±5%; Voltage Rating: 200V; Temperature Coefficient: ±100ppm/℃; Temperature Rating: -55℃~+155℃; ComponentLink1Description: Datasheet; ComponentLink1URL: https://wmsc.lcsc.com/wmsc/upload/file/pdf/v2/lcsc/2304140030_FH--Guangdong-Fenghua-Advanced-Tech-RS-1210K104JT_C304940.pdf; ComponentLink2Description: JLCPCB Part URL; ComponentLink2URL: https://jlcpcb.com/partdetail/C304940
pins: 1, 2
1 alternate drawing of the same symbol

## RS-1210K105JT
designator R?  Resistance: 1MΩ  (hidden comment: *)
Resistor, 1MΩ, ±5%, ±100ppm/℃, SMD 1210; Manufacturer: Uniroyal; Manufacturer Part Number: RS-1210K105JT; Supplier 1: LCSC; Supplier Part Number 1: C341608; JLCPCB Part Number: C341608; Category: Resistors; Package Size: 1210; JLCPCB Basic Part: Yes; Tolerance: ±5%; Temperature Coefficient: ±100ppm/℃; ComponentLink1Description: Datasheet; ComponentLink1URL: https://wmsc.lcsc.com/wmsc/upload/file/pdf/v2/lcsc/2304281804_FH--Guangdong-Fenghua-Advanced-Tech-RS-1210K105JT_C341608.pdf; ComponentLink2Description: JLCPCB Part URL; ComponentLink2URL: https://jlcpcb.com/partdetail/C341608
pins: 1, 2
1 alternate drawing of the same symbol

## RS-1210K110JT
designator R?  Resistance: 11Ω  (hidden comment: *)
Resistor, 11Ω, ±5%, ±100ppm/℃, SMD 1210; Manufacturer: Uniroyal; Manufacturer Part Number: RS-1210K110JT; Supplier 1: LCSC; Supplier Part Number 1: C3036955; JLCPCB Part Number: C3036955; Category: Resistors; Package Size: 1210; JLCPCB Basic Part: Yes; Tolerance: ±5%; Temperature Coefficient: ±100ppm/℃; ComponentLink1Description: Datasheet; ComponentLink1URL: https://wmsc.lcsc.com/wmsc/upload/file/pdf/v2/lcsc/2206301715_FH--Guangdong-Fenghua-Advanced-Tech-RS-1210K110JT_C3036955.pdf; ComponentLink2Description: JLCPCB Part URL; ComponentLink2URL: https://jlcpcb.com/partdetail/C3036955
pins: 1, 2
1 alternate drawing of the same symbol

## RS-1210K120JT
designator R?  Resistance: 12Ω  (hidden comment: *)
Resistor, 12Ω, ±5%, 333.333mW, 200V, ±100ppm/℃, -55℃~+155℃, SMD 1210; Manufacturer: Uniroyal; Manufacturer Part Number: RS-1210K120JT; Supplier 1: LCSC; Supplier Part Number 1: C294805; JLCPCB Part Number: C294805; Power Rating: 333.333mW; Category: Resistors; Package Size: 1210; JLCPCB Basic Part: Yes; Tolerance: ±5%; Voltage Rating: 200V; Temperature Coefficient: ±100ppm/℃; Temperature Rating: -55℃~+155℃; ComponentLink1Description: Datasheet; ComponentLink1URL: https://wmsc.lcsc.com/wmsc/upload/file/pdf/v2/lcsc/2304140030_FH--Guangdong-Fenghua-Advanced-Tech-RS-1210K120JT_C294805.pdf; ComponentLink2Description: JLCPCB Part URL; ComponentLink2URL: https://jlcpcb.com/partdetail/C294805
pins: 1, 2
1 alternate drawing of the same symbol

## RS-1210K121JT
designator R?  Resistance: 120Ω  (hidden comment: *)
Resistor, 120Ω, ±5%, 333.333mW, ±100ppm/℃, SMD 1210; Manufacturer: Uniroyal; Manufacturer Part Number: RS-1210K121JT; Supplier 1: LCSC; Supplier Part Number 1: C880274; JLCPCB Part Number: C880274; Power Rating: 333.333mW; Category: Resistors; Package Size: 1210; JLCPCB Basic Part: Yes; Tolerance: ±5%; Temperature Coefficient: ±100ppm/℃; ComponentLink1Description: Datasheet; ComponentLink1URL: https://wmsc.lcsc.com/wmsc/upload/file/pdf/v2/lcsc/2304140030_FH--Guangdong-Fenghua-Advanced-Tech-RS-1210K121JT_C880274.pdf; ComponentLink2Description: JLCPCB Part URL; ComponentLink2URL: https://jlcpcb.com/partdetail/C880274
pins: 1, 2
1 alternate drawing of the same symbol
